# Altium footprint library 封装库.PcbLib: 755 footprints (part 48 of 48)
Each footprint in its own frame and in the unit in brackets; x right, y up, seen from the top. Pads: shape width x height; smd on the part's side, far side on the other; paste and mask are expansions set on the pad; w line width, h text height; cw(c..) or ccw(c..) is an arc to the next point about the centre after c.
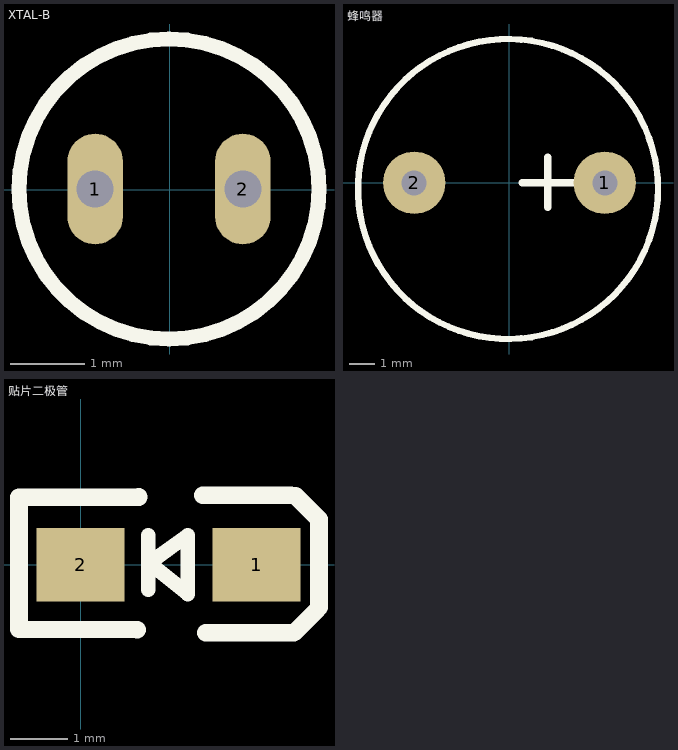
[diagram p47: the footprints below, top view; thin cyan lines are the x and y axes]

## XTAL-B [mm]
pads (2):
  oval 0.75x1.5 hole 0.5: 1(-1.011,0.008) 2(0.989,0.008)
Top Overlay:
  circle w0.2: c-0.011,0.008 r2.032

## 蜂鸣器 [mm]
pads (2):
  round 2.5 hole 1: 1(3.81,0) 2(-3.81,0)
Top Overlay:
  circle w0.254: c-0.06,-0.25 r6
  lines w0.305: 0.508,0 2.54,0 ; 1.524,-0.984 1.524,1.016

## 贴片二极管 [mil]
pads (2):
  rect 60x50 smd: 1(120,0) 2(0,0)
Top Overlay:
  lines w10: 46,-17 46,20 ; 47,1 73,20 73,-20 47,1
  lines w12: 38.52,-44.45 -42,-44 -42,46 39.62,46.1 ; 83.23,47.19 143.23,47.19 ; 85.37,-46.37 145.37,-46.37 ; 145.91,-46.1 160.91,-31.1 ; 146.49,46.92 161.49,31.92 ; 162.49,-29 162.49,31